# Altium footprint library 6-Connectors-4.PcbLib: 166 footprints (part 12 of 12)
Each footprint in its own frame and in the unit in brackets; x right, y up, seen from the top. Pads: shape width x height; smd on the part's side, far side on the other; paste and mask are expansions set on the pad; w line width, h text height; cw(c..) or ccw(c..) is an arc to the next point about the centre after c.
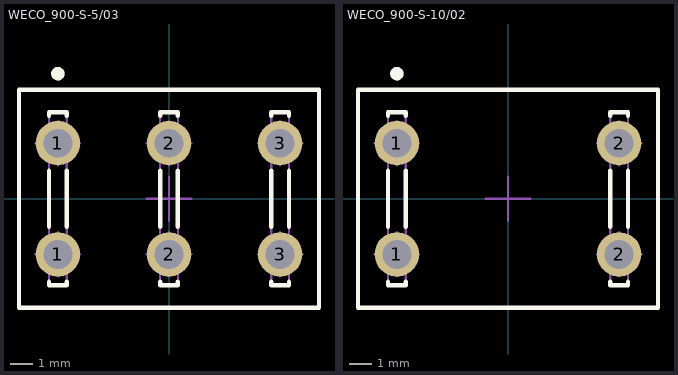
[diagram p11: the footprints below, top view; thin cyan lines are the x and y axes]

## WECO_900-S-5/03 [mm] "5mm Spacing, 3 Tabs 6.3mmx2.8mm Connectors for Printed Circuit Boards"
height 15
pads (6):
  round 2 hole 1.3: 1(-5,-2.5) 1(-5,2.5) 2(0,-2.5) 2(0,2.5) 3(5,-2.5) 3(5,2.5)
Top Overlay:
  circle w0.3: c-5,5.628 r0.15
  lines w0.2: -5.4,-3.737 -5.4,-3.9 -4.6,-3.9 -4.6,-3.737 ; -5.4,-1.263 -5.4,1.263 ; -5.4,3.737 -5.4,3.9 -4.6,3.9 -4.6,3.737 ; -4.6,-1.263 -4.6,1.263 ; -0.4,-3.737 -0.4,-3.9 0.4,-3.9 0.4,-3.737 ; -0.4,-1.263 -0.4,1.263 ; -0.4,3.737 -0.4,3.9 0.4,3.9 0.4,3.737 ; 0.4,-1.263 0.4,1.263 ; 4.6,-3.737 4.6,-3.9 5.4,-3.9 5.4,-3.737 ; 4.6,-1.263 4.6,1.263 ; 4.6,3.737 4.6,3.9 5.4,3.9 5.4,3.737 ; 5.4,-1.263 5.4,1.263 ; -6.75,-4.9 6.75,-4.9 6.75,4.9 -6.75,4.9 -6.75,-4.9
Mechanical 8:
  lines w0.1: -6,-2.5 -5,-2.5 ; -6,2.5 -5,2.5 ; -5,-3.5 -5,-2.5 ; -5,-1.5 -5,-2.5 ; -5,1.5 -5,2.5 ; -5,3.5 -5,2.5 ; -4,-2.5 -5,-2.5 ; -4,2.5 -5,2.5 ; -1,-2.5 0,-2.5 ; -1,0 0,0 ; -1,2.5 0,2.5 ; 0,-3.5 0,-2.5 ; 0,-1.5 0,-2.5 ; 0,-1 0,0 ; 0,1 0,0 ; 0,1.5 0,2.5 ; 0,3.5 0,2.5 ; 1,-2.5 0,-2.5 ; 1,0 0,0 ; 1,2.5 0,2.5 ; 4,-2.5 5,-2.5 ; 4,2.5 5,2.5 ; 5,-3.5 5,-2.5 ; 5,-1.5 5,-2.5 ; 5,1.5 5,2.5 ; 5,3.5 5,2.5 ; 6,-2.5 5,-2.5 ; 6,2.5 5,2.5
Mechanical 14:
  circle w0.3: c-5,5.628 r0.15
  lines w0.1: -6.75,-4.9 6.75,-4.9 6.75,4.9 -6.75,4.9 -6.75,-4.9 ; -5.4,-3.9 -4.6,-3.9 -4.6,3.9 -5.4,3.9 -5.4,-3.9 ; -0.4,-3.9 0.4,-3.9 0.4,3.9 -0.4,3.9 -0.4,-3.9 ; 4.6,-3.9 5.4,-3.9 5.4,3.9 4.6,3.9 4.6,-3.9
3D body "WECO_900-S-5-03.stp": height 15, standoff -4.5, extent -6.75,-4.9 6.75,4.9

## WECO_900-S-10/02 [mm] "10mm Spacing, 2 Tabs 6.3mmx2.8mm Connectors for Printed Circuit Boards"
height 15
pads (4):
  round 2 hole 1.3: 1(-5,-2.5) 1(-5,2.5) 2(5,-2.5) 2(5,2.5)
Top Overlay:
  circle w0.3: c-5,5.628 r0.15
  lines w0.2: -5.4,-3.737 -5.4,-3.9 -4.6,-3.9 -4.6,-3.737 ; -5.4,-1.263 -5.4,1.263 ; -5.4,3.737 -5.4,3.9 -4.6,3.9 -4.6,3.737 ; -4.6,-1.263 -4.6,1.263 ; 4.6,-3.737 4.6,-3.9 5.4,-3.9 5.4,-3.737 ; 4.6,-1.263 4.6,1.263 ; 4.6,3.737 4.6,3.9 5.4,3.9 5.4,3.737 ; 5.4,-1.263 5.4,1.263 ; -6.75,-4.9 6.75,-4.9 6.75,4.9 -6.75,4.9 -6.75,-4.9
Mechanical 8:
  lines w0.1: -6,-2.5 -5,-2.5 ; -6,2.5 -5,2.5 ; -5,-3.5 -5,-2.5 ; -5,-1.5 -5,-2.5 ; -5,1.5 -5,2.5 ; -5,3.5 -5,2.5 ; -4,-2.5 -5,-2.5 ; -4,2.5 -5,2.5 ; -1,0 0,0 ; 0,-1 0,0 ; 0,1 0,0 ; 1,0 0,0 ; 4,-2.5 5,-2.5 ; 4,2.5 5,2.5 ; 5,-3.5 5,-2.5 ; 5,-1.5 5,-2.5 ; 5,1.5 5,2.5 ; 5,3.5 5,2.5 ; 6,-2.5 5,-2.5 ; 6,2.5 5,2.5
Mechanical 14:
  circle w0.3: c-5,5.628 r0.15
  lines w0.1: -6.75,-4.9 6.75,-4.9 6.75,4.9 -6.75,4.9 -6.75,-4.9 ; -5.4,-3.9 -4.6,-3.9 -4.6,3.9 -5.4,3.9 -5.4,-3.9 ; 4.6,-3.9 5.4,-3.9 5.4,3.9 4.6,3.9 4.6,-3.9
3D body "WECO_900-S-10-02.stp": height 15, standoff -4.5, extent -6.75,-4.9 6.75,4.9